# Altium footprint library vertigo.PcbLib: 115 footprints (part 8 of 8)
Each footprint in its own frame and in the unit in brackets; x right, y up, seen from the top. Pads: shape width x height; smd on the part's side, far side on the other; paste and mask are expansions set on the pad; w line width, h text height; cw(c..) or ccw(c..) is an arc to the next point about the centre after c.
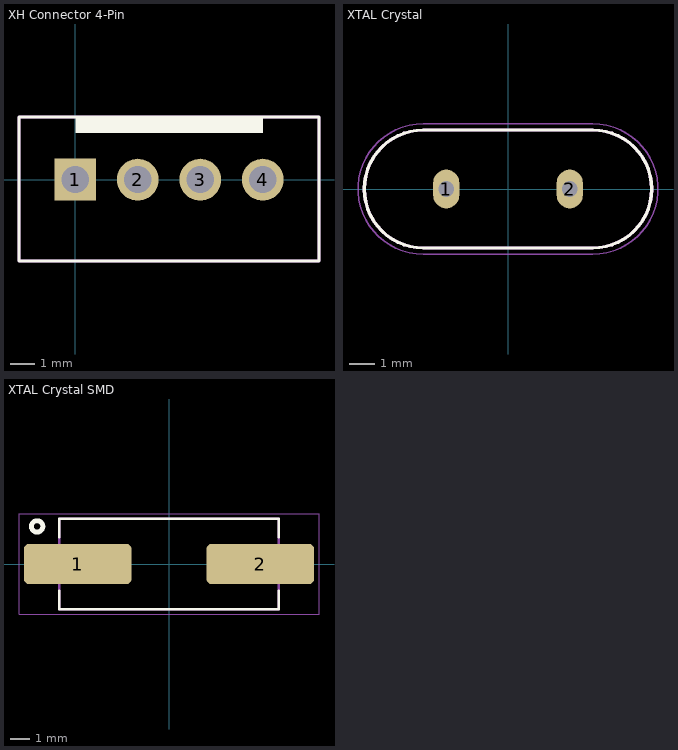
[diagram p7: the footprints below, top view; thin cyan lines are the x and y axes]

## XH Connector 4-Pin [mm] "XH Connector 4-Pin"
pads (4):
  rect 1.7x1.7 hole 1.1: 1(0,0)
  round 1.7 hole 1.1: 2(2.54,0) 3(5.08,0) 4(7.62,0)
Top Overlay:
  rectangle: 0,1.905 7.62,2.54
  lines w0.127: -2.286,-3.302 -2.286,2.54 9.906,2.54 9.906,-3.302 -2.286,-3.302
Mechanical 13:
  lines w0.127: -2.286,-3.302 9.906,-3.302 9.906,2.54 -2.286,2.54 -2.286,-3.302
3D body "JST - XH - Thru - 4Pin - 2.5mm (Genuine).stp": height 7.21, standoff -3, extent -2.277,-3.302 9.897,2.54

## XTAL Crystal [mm] "HC-49/US Package"
pads (2):
  oval 1.03x1.53 hole 0.63: 1(-2.44,0) 2(2.44,0)
Top Overlay:
  lines w0.127: -3.345,-2.33 cw(c-3.345,0) -3.345,2.33 3.345,2.33 cw(c3.345,0) 3.345,-2.33 -3.345,-2.33
Mechanical 13:
  lines w0.127: -3.345,-2.33 cw(c-3.345,0) -3.345,2.33 3.345,2.33 cw(c3.345,0) 3.345,-2.33 -3.345,-2.33
Mechanical 15:
  lines w0.05: -3.345,-2.58 cw(c-3.345,0) -3.345,2.58 3.345,2.58 cw(c3.345,0) 3.345,-2.58 -3.345,-2.58
3D body "ECS-184-18-4X.STEP": height 3.5, standoff -12.7, extent -5.675,-2.325 5.675,2.325

## XTAL Crystal SMD [mm] "HC-49/US SMD Package"
pads (2):
  rrect25% 5.6x2.1 smd: 1(-4.75,0) 2(4.75,0)
Top Overlay:
  circle w0.254: c-6.858,1.956 r0.296
  lines w0.127: -5.7,-1.4 -5.7,-2.35 5.7,-2.35 5.7,-1.4 ; -5.7,1.4 -5.7,2.35 5.7,2.35 5.7,1.4
Mechanical 13:
  lines w0.127: -5.7,-2.35 5.7,-2.35 5.7,2.35 -5.7,2.35 -5.7,-2.35
Mechanical 15:
  lines w0.05: -7.8,-2.6 7.8,-2.6 7.8,2.6 -7.8,2.6 -7.8,-2.6
3D body "ABLS2-16.000MHZ-D4Y-T--3DModel-STEP-400430.STEP": height 3.26, standoff 0, extent -6.35,-2.349 6.35,2.349